# Altium footprint library SMT IC footprints.PcbLib: 363 footprints (part 23 of 23)
Each footprint in its own frame and in the unit in brackets; x right, y up, seen from the top. Pads: shape width x height; smd on the part's side, far side on the other; paste and mask are expansions set on the pad; w line width, h text height; cw(c..) or ccw(c..) is an arc to the next point about the centre after c.
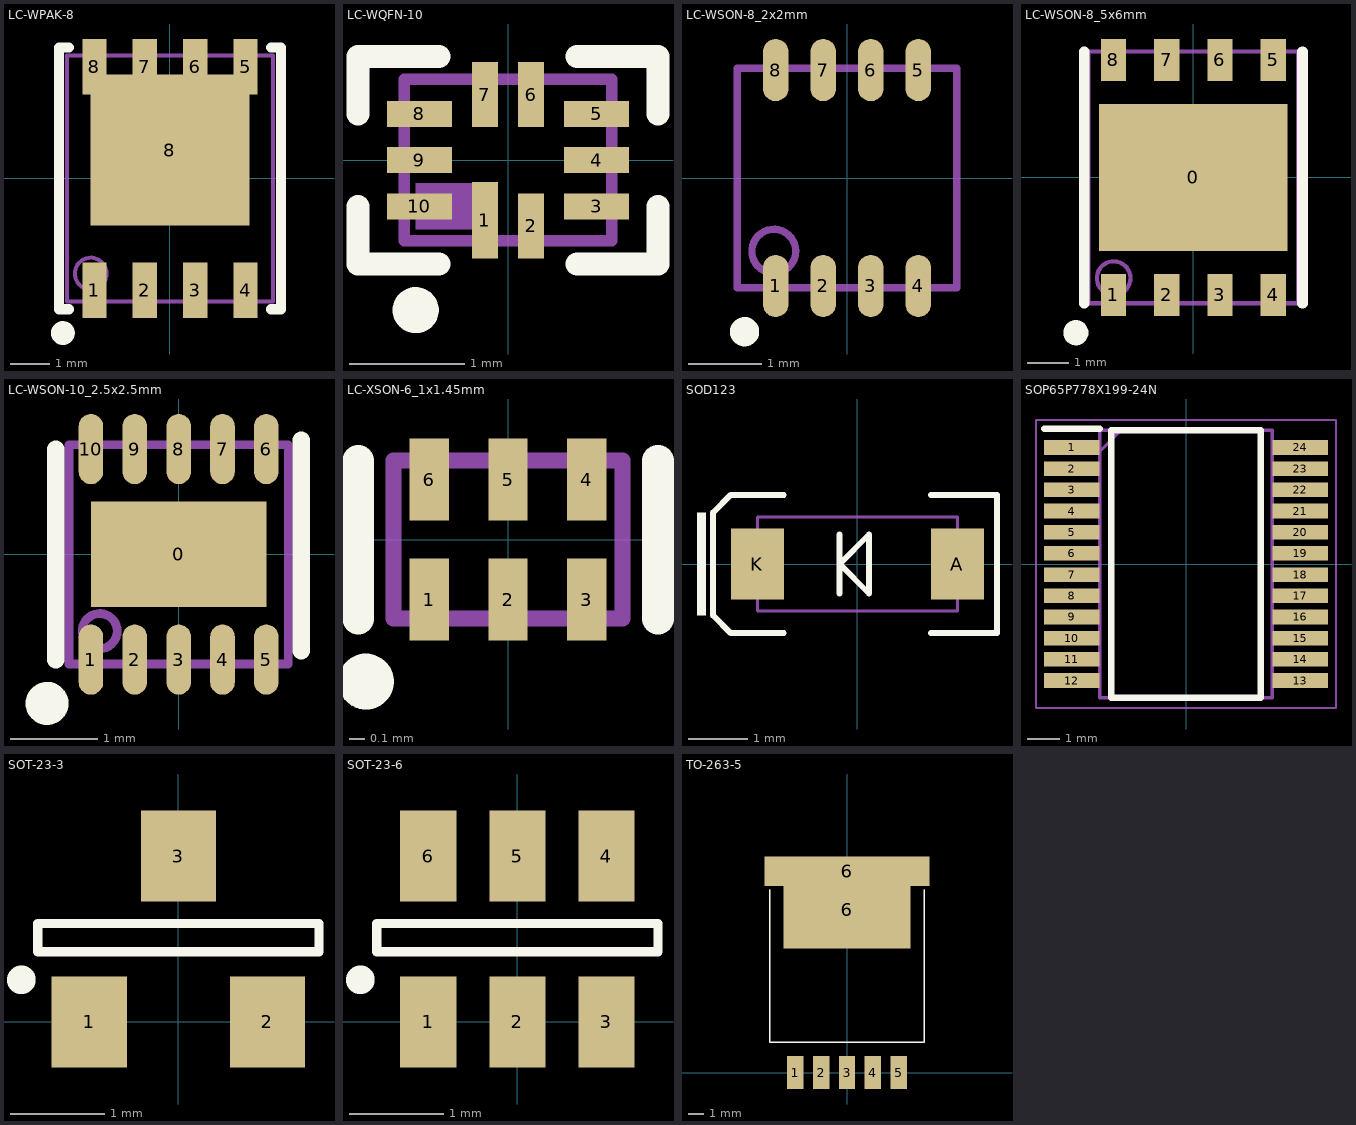
[diagram p22: the footprints below, top view; thin cyan lines are the x and y axes]

## LC-WPAK-8 [mm]
pads (9):
  rect 0.61x1.4 smd: 1(-1.905,-2.816) 2(-0.635,-2.816) 3(0.635,-2.816) 4(1.905,-2.816) 5(1.905,2.816) 6(0.635,2.816) 7(-0.635,2.816) 8(-1.905,2.816)
  rect 4x3.81 smd: 8(0,0.716)
Top Overlay:
  circle w0.3: c-2.7,-3.9 r0.15
  lines w0.254: -2.55,-3.3 -2.8,-3.3 -2.8,3.3 -2.55,3.3 ; 2.55,-3.3 2.8,-3.3 2.8,3.3 2.55,3.3
Mechanical 13:
  circle w0.1: c-2,-2.4 r0.4
  lines w0.1: -2.6,-3.1 -2.6,3.1 2.6,3.1 2.6,-3.1 -2.6,-3.1

## LC-WQFN-10 [mm]
pads (10):
  rect 0.225x0.663 smd mask+0.051: 1(-0.2,-0.519)
  rect 0.225x0.563 smd mask+0.051: 2(0.2,-0.569) 6(0.2,0.569) 7(-0.2,0.569)
  rect 0.563x0.225 smd mask+0.051: 3(0.768,-0.4) 4(0.768,0) 5(0.768,0.4) 8(-0.768,0.4) 9(-0.768,0) 10(-0.768,-0.4)
Top Overlay:
  circle w0.2: c-0.8,-1.3 r0.1
  lines w0.2: -1.3,-0.4 -1.3,-0.9 -0.6,-0.9 ; -1.3,0.4 -1.3,0.9 -0.6,0.9 ; 0.6,-0.9 1.3,-0.9 1.3,-0.4 ; 0.6,0.9 1.3,0.9 1.3,0.4
Mechanical 13:
  region: -0.3,-0.6 -0.3,-0.2 -0.8,-0.2 -0.8,-0.6
  lines w0.1: -0.9,-0.7 -0.9,0.7 0.9,0.7 0.9,-0.7 -0.9,-0.7

## LC-WSON-8_2x2mm [mm]
pads (8):
  oval 0.35x0.85 smd mask+0.051: 1(-0.975,-1.475) 2(-0.325,-1.475) 3(0.325,-1.475) 4(0.975,-1.475) 5(0.975,1.475) 6(0.325,1.475) 7(-0.325,1.475) 8(-0.975,1.475)
Top Overlay:
  circle w0.2: c-1.4,-2.1 r0.1
Mechanical 13:
  circle w0.1: c-1,-1 r0.3
  lines w0.1: -1.5,-1.5 -1.5,1.5 1.5,1.5 1.5,-1.5 -1.5,-1.5

## LC-WSON-8_5x6mm [mm]
pads (9):
  rect 4.5x3.5 smd: 0(0,0)
  rect 0.6x1 smd: 1(-1.905,-2.8) 2(-0.635,-2.8) 3(0.635,-2.8) 4(1.905,-2.8) 5(1.905,2.8) 6(0.635,2.8) 7(-0.635,2.8) 8(-1.905,2.8)
Top Overlay:
  circle w0.3: c-2.8,-3.7 r0.15
  lines w0.254: -2.6,-3 -2.6,3 ; 2.6,-3 2.6,3
Mechanical 13:
  circle w0.1: c-1.9,-2.4 r0.4
  lines w0.1: -2.5,-3 2.5,-3 2.5,3 -2.5,3 -2.5,-3

## LC-WSON-10_2.5x2.5mm [mm]
pads (11):
  rect 2x1.2 smd mask+0.051: 0(0,0)
  oval 0.28x0.8 smd paste-0.025 mask+0.051: 1(-1,-1.2) 2(-0.5,-1.2) 3(0,-1.2) 4(0.5,-1.2) 5(1,-1.2) 6(1,1.2) 7(0.5,1.2) 8(0,1.2) 9(-0.5,1.2) 10(-1,1.2)
Top Overlay:
  circle w0.25: c-1.5,-1.7 r0.12
  lines w0.2: -1.4,-1.2 -1.4,1.2 ; 1.4,-1.1 1.4,1.3
Mechanical 13:
  circle w0.1: c-0.9,-0.875 r0.2
  lines w0.1: -1.25,-1.25 -1.25,1.25 1.25,1.25 1.25,-1.25 -1.25,-1.25

## LC-XSON-6_1x1.45mm [mm]
pads (6):
  rect 0.25x0.52 smd mask+0.051: 1(-0.5,-0.38) 2(0,-0.38) 3(0.5,-0.38) 4(0.5,0.38) 5(0,0.38) 6(-0.5,0.38)
Top Overlay:
  circle w0.254: c-0.9,-0.9 r0.05
  lines w0.2: -0.95,-0.5 -0.95,0.5 ; 0.95,-0.5 0.95,0.5
Mechanical 13:
  lines w0.1: -0.725,-0.5 -0.725,0.5 0.725,0.5 0.725,-0.5 -0.725,-0.5

## SOD123 [mm]
height 1.35
pads (2):
  rect 0.9x1.2 smd: A(1.7,0) K(-1.7,0)
Top Overlay:
  rectangle: -2.725,-0.875 -2.575,0.875
  lines w0.1: -1.25,-1.175 -2.15,-1.175 -2.45,-0.875 -2.45,0 -2.45,0.875 -2.15,1.175 -1.25,1.175 ; -0.3,-0.5 -0.3,0.5 ; 1.25,-1.175 2.375,-1.175 ; 1.25,1.175 2.375,1.175 2.375,-1.15 2.35,-1.175 ; -0.3,0 0.2,-0.5 0.2,0.5 -0.3,0
Mechanical 13:
  lines w0.05: -1.7,-0.8 1.7,-0.8 1.7,0.8 -1.7,0.8 -1.7,-0.8
3D body "User Library-SOD-123 CASE 425-04_1.sldprt": height 0.51, standoff 0, extent -1.65,-0.3 -1.302,0.3
3D body "User Library-SOD-123 CASE 425-04_2.sldprt": height 1.2, standoff 0, extent -1.3,-0.8 1.65,0.8

## SOP65P778X199-24N [mm]
pads (24):
  rect 1.705x0.45 smd: 1(-3.498,3.575) 2(-3.498,2.925) 3(-3.498,2.275) 4(-3.498,1.625) 5(-3.498,0.975) 6(-3.498,0.325) 7(-3.498,-0.325) 8(-3.498,-0.975) 9(-3.498,-1.625) 10(-3.498,-2.275) 11(-3.498,-2.925) 12(-3.498,-3.575) 13(3.498,-3.575) 14(3.498,-2.925) 15(3.498,-2.275) 16(3.498,-1.625) 17(3.498,-0.975) 18(3.498,-0.325) 19(3.498,0.325) 20(3.498,0.975) 21(3.498,1.625) 22(3.498,2.275) 23(3.498,2.925) 24(3.498,3.575)
Top Overlay:
  lines w0.2: -4.35,4.15 -2.645,4.15 ; -2.295,-4.1 -2.295,4.1 2.295,4.1 2.295,-4.1 -2.295,-4.1
Mechanical 13:
  lines w0.1: -2.645,3.45 -1.995,4.1 ; -2.645,-4.1 -2.645,4.1 2.645,4.1 2.645,-4.1 -2.645,-4.1
Mechanical 15:
  lines w0.05: -4.6,-4.415 -4.6,4.415 4.6,4.415 4.6,-4.415 -4.6,-4.415
3D body "MAX5440EAG+.stp": height 1.99, standoff 0, extent -3.888,-4.1 3.888,4.1

## SOT-23-3 [mm] "SOT-23-3 package"
height 1.12
pads (3):
  rect 0.802x0.972 smd: 1(-0.95,0) 2(0.95,0) 3(0,1.77)
Top Overlay:
  circle w0.254: c-1.675,0.45 r0.025
  lines w0.1: -1.5,0.75 -1.5,1.05 1.5,1.05 1.5,0.75 -1.5,0.75

## SOT-23-6 [mm] "SOT-23-6 package"
height 1.35
pads (6):
  rect 0.6x0.972 smd: 1(-0.95,0) 2(0,0) 3(0.95,0) 4(0.95,1.77) 5(0,1.77) 6(-0.95,1.77)
Top Overlay:
  circle w0.254: c-1.675,0.45 r0.025
  lines w0.1: -1.5,0.75 -1.5,1.05 1.5,1.05 1.5,0.75 -1.5,0.75

## TO-263-5 [mm] "TO-263 5-pin package with heatsink"
height 4.6
pads (7):
  rect 1.07x2.16 smd: 1(-3.4,0) 2(-1.7,0) 3(0,0) 4(1.7,0) 5(3.4,0)
  rect 8.33x5.08 smd: 6(0,10.675)
  rect 10.8x1.91 smd: 6(0,13.215)
Top Overlay:
  lines w0.1: -5.08,12 -5.08,2 5.08,2 5.08,12